# Altium schematic symbol library jlcpcb_2025_04_capacitors_extended_0805.schlib: 3281 symbols (part 4 of 18)
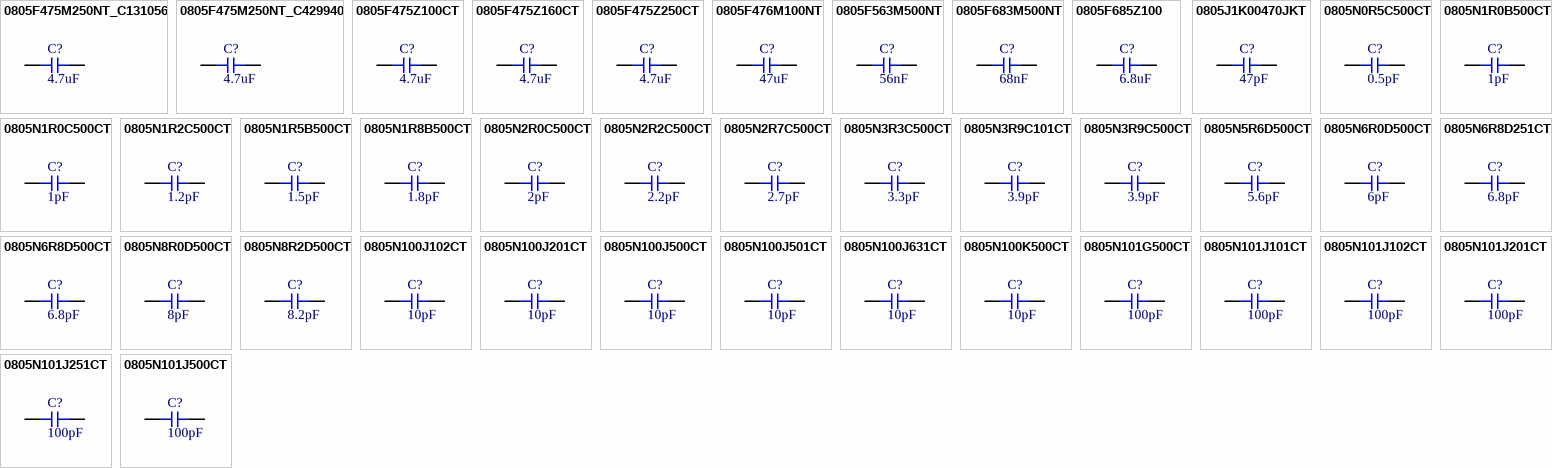
[diagram p85: symbols 0805F475M250NT_C131056 to 0805N101J500CT]

## 0805N1R5B500CT
designator C?  Capacitance: 1.5pF  (hidden comment: *)
Capacitor, Ceramic (MLCC), 1.5pF, 50V, NP0, SMD 0805; Manufacturer: Walsin Tech Corp; Manufacturer Part Number: 0805N1R5B500CT; Package Size: 0805; JLCPCB Basic Part: No; JLCPCB Part Number: C509268; Supplier 1: LCSC; Category: Capacitors - MLCC; Supplier Part Number 1: C509268; Voltage Rating: 50V; Temperature Coefficient: NP0; RoHS: Yes; ComponentLink1Description: Datasheet; ComponentLink1URL: https://wmsc.lcsc.com/wmsc/upload/file/pdf/v2/lcsc/2304140030_Walsin-Tech-Corp-0805N1R5B500CT_C509268.pdf; ComponentLink2Description: JLCPCB Part URL; ComponentLink2URL: https://jlcpcb.com/partdetail/C509268; ComponentLink3Description: LCSC Part URL; ComponentLink3URL: https://lcsc.com/product-detail/Multilayer-Ceramic-Capacitors-MLCC---SMD-SMT_Walsin-Tech-Corp-Walsin-Tech-Corp-0805N1R5B500CT_C509268.html
footprint CAP-0805 (0805 (2012M) Capacitor)
pins: 1, 2

## 0805N1R8B500CT
designator C?  Capacitance: 1.8pF  (hidden comment: *)
Capacitor, Ceramic (MLCC), 1.8pF, 50V, NP0, SMD 0805; Manufacturer: Walsin Tech Corp; Manufacturer Part Number: 0805N1R8B500CT; Package Size: 0805; JLCPCB Basic Part: No; JLCPCB Part Number: C509269; Supplier 1: LCSC; Category: Capacitors - MLCC; Supplier Part Number 1: C509269; Voltage Rating: 50V; Temperature Coefficient: NP0; RoHS: Yes; ComponentLink1Description: Datasheet; ComponentLink1URL: https://wmsc.lcsc.com/wmsc/upload/file/pdf/v2/lcsc/2304140030_Walsin-Tech-Corp-0805N1R8B500CT_C509269.pdf; ComponentLink2Description: JLCPCB Part URL; ComponentLink2URL: https://jlcpcb.com/partdetail/C509269; ComponentLink3Description: LCSC Part URL; ComponentLink3URL: https://lcsc.com/product-detail/Multilayer-Ceramic-Capacitors-MLCC---SMD-SMT_Walsin-Tech-Corp-Walsin-Tech-Corp-0805N1R8B500CT_C509269.html
footprint CAP-0805 (0805 (2012M) Capacitor)
pins: 1, 2

## 0805N2R0C500CT
designator C?  Capacitance: 2pF  (hidden comment: *)
Capacitor, Ceramic (MLCC), 2pF, 50V, NP0, SMD 0805; Manufacturer: Walsin Tech Corp; Manufacturer Part Number: 0805N2R0C500CT; Package Size: 0805; JLCPCB Basic Part: No; JLCPCB Part Number: C296094; Supplier 1: LCSC; Category: Capacitors - MLCC; Supplier Part Number 1: C296094; Voltage Rating: 50V; Temperature Coefficient: NP0; RoHS: Yes; ComponentLink1Description: Datasheet; ComponentLink1URL: https://wmsc.lcsc.com/wmsc/upload/file/pdf/v2/lcsc/2304140030_Walsin-Tech-Corp-0805N2R0C500CT_C296094.pdf; ComponentLink2Description: JLCPCB Part URL; ComponentLink2URL: https://jlcpcb.com/partdetail/C296094; ComponentLink3Description: LCSC Part URL; ComponentLink3URL: https://lcsc.com/product-detail/Multilayer-Ceramic-Capacitors-MLCC---SMD-SMT_Walsin-Tech-Corp-Walsin-Tech-Corp-0805N2R0C500CT_C296094.html
footprint CAP-0805 (0805 (2012M) Capacitor)
pins: 1, 2

## 0805N2R2C500CT
designator C?  Capacitance: 2.2pF  (hidden comment: *)
Capacitor, Ceramic (MLCC), 2.2pF, 50V, NP0, SMD 0805; Manufacturer: Walsin Tech Corp; Manufacturer Part Number: 0805N2R2C500CT; Package Size: 0805; JLCPCB Basic Part: No; JLCPCB Part Number: C424848; Supplier 1: LCSC; Category: Capacitors - MLCC; Supplier Part Number 1: C424848; Voltage Rating: 50V; Temperature Coefficient: NP0; RoHS: Yes; ComponentLink1Description: Datasheet; ComponentLink1URL: https://wmsc.lcsc.com/wmsc/upload/file/pdf/v2/lcsc/2304140030_Walsin-Tech-Corp-0805N2R2C500CT_C424848.pdf; ComponentLink2Description: JLCPCB Part URL; ComponentLink2URL: https://jlcpcb.com/partdetail/C424848; ComponentLink3Description: LCSC Part URL; ComponentLink3URL: https://lcsc.com/product-detail/Multilayer-Ceramic-Capacitors-MLCC---SMD-SMT_Walsin-Tech-Corp-Walsin-Tech-Corp-0805N2R2C500CT_C424848.html
footprint CAP-0805 (0805 (2012M) Capacitor)
pins: 1, 2

## 0805N2R7C500CT
designator C?  Capacitance: 2.7pF  (hidden comment: *)
Capacitor, Ceramic (MLCC), 2.7pF, 50V, NP0, SMD 0805; Manufacturer: Walsin Tech Corp; Manufacturer Part Number: 0805N2R7C500CT; Package Size: 0805; JLCPCB Basic Part: No; JLCPCB Part Number: C296095; Supplier 1: LCSC; Category: Capacitors - MLCC; Supplier Part Number 1: C296095; Voltage Rating: 50V; Temperature Coefficient: NP0; RoHS: Yes; ComponentLink1Description: Datasheet; ComponentLink1URL: https://wmsc.lcsc.com/wmsc/upload/file/pdf/v2/lcsc/2304140030_Walsin-Tech-Corp-0805N2R7C500CT_C296095.pdf; ComponentLink2Description: JLCPCB Part URL; ComponentLink2URL: https://jlcpcb.com/partdetail/C296095; ComponentLink3Description: LCSC Part URL; ComponentLink3URL: https://lcsc.com/product-detail/Multilayer-Ceramic-Capacitors-MLCC---SMD-SMT_Walsin-Tech-Corp-Walsin-Tech-Corp-0805N2R7C500CT_C296095.html
footprint CAP-0805 (0805 (2012M) Capacitor)
pins: 1, 2

## 0805N3R3C500CT
designator C?  Capacitance: 3.3pF  (hidden comment: *)
Capacitor, Ceramic (MLCC), 3.3pF, 50V, NP0, SMD 0805; Manufacturer: Walsin Tech Corp; Manufacturer Part Number: 0805N3R3C500CT; Package Size: 0805; JLCPCB Basic Part: No; JLCPCB Part Number: C424849; Supplier 1: LCSC; Category: Capacitors - MLCC; Supplier Part Number 1: C424849; Voltage Rating: 50V; Temperature Coefficient: NP0; RoHS: Yes; ComponentLink1Description: Datasheet; ComponentLink1URL: https://wmsc.lcsc.com/wmsc/upload/file/pdf/v2/lcsc/2304140030_Walsin-Tech-Corp-0805N3R3C500CT_C424849.pdf; ComponentLink2Description: JLCPCB Part URL; ComponentLink2URL: https://jlcpcb.com/partdetail/C424849; ComponentLink3Description: LCSC Part URL; ComponentLink3URL: https://lcsc.com/product-detail/Multilayer-Ceramic-Capacitors-MLCC---SMD-SMT_Walsin-Tech-Corp-Walsin-Tech-Corp-0805N3R3C500CT_C424849.html
footprint CAP-0805 (0805 (2012M) Capacitor)
pins: 1, 2

## 0805N3R9C101CT
designator C?  Capacitance: 3.9pF  (hidden comment: *)
Capacitor, Ceramic (MLCC), 3.9pF, 100V, C0G, SMD 0805; Manufacturer: Walsin Tech Corp; Manufacturer Part Number: 0805N3R9C101CT; Package Size: 0805; JLCPCB Basic Part: No; JLCPCB Part Number: C3903056; Supplier 1: LCSC; Category: Capacitors - MLCC; Supplier Part Number 1: C3903056; Voltage Rating: 100V; Temperature Coefficient: C0G; RoHS: Yes; ComponentLink1Description: Datasheet; ComponentLink1URL: https://wmsc.lcsc.com/wmsc/upload/file/pdf/v2/lcsc/2309201537_Walsin-Tech-Corp-0805N3R9C101CT_C3903056.pdf; ComponentLink2Description: JLCPCB Part URL; ComponentLink2URL: https://jlcpcb.com/partdetail/C3903056; ComponentLink3Description: LCSC Part URL; ComponentLink3URL: https://lcsc.com/product-detail/Multilayer-Ceramic-Capacitors-MLCC---SMD-SMT_Walsin-Tech-Corp-Walsin-Tech-Corp-0805N3R9C101CT_C3903056.html
footprint CAP-0805 (0805 (2012M) Capacitor)
pins: 1, 2

## 0805N3R9C500CT
designator C?  Capacitance: 3.9pF  (hidden comment: *)
Capacitor, Ceramic (MLCC), 3.9pF, 50V, NP0, SMD 0805; Manufacturer: Walsin Tech Corp; Manufacturer Part Number: 0805N3R9C500CT; Package Size: 0805; JLCPCB Basic Part: No; JLCPCB Part Number: C296100; Supplier 1: LCSC; Category: Capacitors - MLCC; Supplier Part Number 1: C296100; Voltage Rating: 50V; Temperature Coefficient: NP0; RoHS: Yes; ComponentLink1Description: Datasheet; ComponentLink1URL: https://wmsc.lcsc.com/wmsc/upload/file/pdf/v2/lcsc/2304140030_Walsin-Tech-Corp-0805N3R9C500CT_C296100.pdf; ComponentLink2Description: JLCPCB Part URL; ComponentLink2URL: https://jlcpcb.com/partdetail/C296100; ComponentLink3Description: LCSC Part URL; ComponentLink3URL: https://lcsc.com/product-detail/Multilayer-Ceramic-Capacitors-MLCC---SMD-SMT_Walsin-Tech-Corp-Walsin-Tech-Corp-0805N3R9C500CT_C296100.html
footprint CAP-0805 (0805 (2012M) Capacitor)
pins: 1, 2

## 0805N5R6D500CT
designator C?  Capacitance: 5.6pF  (hidden comment: *)
Capacitor, Ceramic (MLCC), 5.6pF, 50V, NP0, SMD 0805; Manufacturer: Walsin Tech Corp; Manufacturer Part Number: 0805N5R6D500CT; Package Size: 0805; JLCPCB Basic Part: No; JLCPCB Part Number: C296104; Supplier 1: LCSC; Category: Capacitors - MLCC; Supplier Part Number 1: C296104; Voltage Rating: 50V; Temperature Coefficient: NP0; RoHS: Yes; ComponentLink1Description: Datasheet; ComponentLink1URL: https://wmsc.lcsc.com/wmsc/upload/file/pdf/v2/lcsc/2304140030_Walsin-Tech-Corp-0805N5R6D500CT_C296104.pdf; ComponentLink2Description: JLCPCB Part URL; ComponentLink2URL: https://jlcpcb.com/partdetail/C296104; ComponentLink3Description: LCSC Part URL; ComponentLink3URL: https://lcsc.com/product-detail/Multilayer-Ceramic-Capacitors-MLCC---SMD-SMT_Walsin-Tech-Corp-Walsin-Tech-Corp-0805N5R6D500CT_C296104.html
footprint CAP-0805 (0805 (2012M) Capacitor)
pins: 1, 2

## 0805N6R0D500CT
designator C?  Capacitance: 6pF  (hidden comment: *)
Capacitor, Ceramic (MLCC), 6pF, 50V, NP0, SMD 0805; Manufacturer: Walsin Tech Corp; Manufacturer Part Number: 0805N6R0D500CT; Package Size: 0805; JLCPCB Basic Part: No; JLCPCB Part Number: C424859; Supplier 1: LCSC; Category: Capacitors - MLCC; Supplier Part Number 1: C424859; Voltage Rating: 50V; Temperature Coefficient: NP0; RoHS: Yes; ComponentLink1Description: Datasheet; ComponentLink1URL: https://wmsc.lcsc.com/wmsc/upload/file/pdf/v2/lcsc/2304140030_Walsin-Tech-Corp-0805N6R0D500CT_C424859.pdf; ComponentLink2Description: JLCPCB Part URL; ComponentLink2URL: https://jlcpcb.com/partdetail/C424859; ComponentLink3Description: LCSC Part URL; ComponentLink3URL: https://lcsc.com/product-detail/Multilayer-Ceramic-Capacitors-MLCC---SMD-SMT_Walsin-Tech-Corp-Walsin-Tech-Corp-0805N6R0D500CT_C424859.html
footprint CAP-0805 (0805 (2012M) Capacitor)
pins: 1, 2

## 0805N6R8D251CT
designator C?  Capacitance: 6.8pF  (hidden comment: *)
Capacitor, Ceramic (MLCC), 6.8pF, 250V, C0G, SMD 0805; Manufacturer: Walsin Tech Corp; Manufacturer Part Number: 0805N6R8D251CT; Package Size: 0805; JLCPCB Basic Part: No; JLCPCB Part Number: C3887194; Supplier 1: LCSC; Category: Capacitors - MLCC; Supplier Part Number 1: C3887194; Voltage Rating: 250V; Temperature Coefficient: C0G; RoHS: Yes; ComponentLink1Description: Datasheet; ComponentLink1URL: https://wmsc.lcsc.com/wmsc/upload/file/pdf/v2/lcsc/2309201537_Walsin-Tech-Corp-0805N6R8D251CT_C3887194.pdf; ComponentLink2Description: JLCPCB Part URL; ComponentLink2URL: https://jlcpcb.com/partdetail/C3887194; ComponentLink3Description: LCSC Part URL; ComponentLink3URL: https://lcsc.com/product-detail/Multilayer-Ceramic-Capacitors-MLCC---SMD-SMT_Walsin-Tech-Corp-Walsin-Tech-Corp-0805N6R8D251CT_C3887194.html
footprint CAP-0805 (0805 (2012M) Capacitor)
pins: 1, 2

## 0805N6R8D500CT
designator C?  Capacitance: 6.8pF  (hidden comment: *)
Capacitor, Ceramic (MLCC), 6.8pF, 50V, NP0, SMD 0805; Manufacturer: Walsin Tech Corp; Manufacturer Part Number: 0805N6R8D500CT; Package Size: 0805; JLCPCB Basic Part: No; JLCPCB Part Number: C296105; Supplier 1: LCSC; Category: Capacitors - MLCC; Supplier Part Number 1: C296105; Voltage Rating: 50V; Temperature Coefficient: NP0; RoHS: Yes; ComponentLink1Description: Datasheet; ComponentLink1URL: https://wmsc.lcsc.com/wmsc/upload/file/pdf/v2/lcsc/2304140030_Walsin-Tech-Corp-0805N6R8D500CT_C296105.pdf; ComponentLink2Description: JLCPCB Part URL; ComponentLink2URL: https://jlcpcb.com/partdetail/C296105; ComponentLink3Description: LCSC Part URL; ComponentLink3URL: https://lcsc.com/product-detail/Multilayer-Ceramic-Capacitors-MLCC---SMD-SMT_Walsin-Tech-Corp-Walsin-Tech-Corp-0805N6R8D500CT_C296105.html
footprint CAP-0805 (0805 (2012M) Capacitor)
pins: 1, 2

## 0805N8R0D500CT
designator C?  Capacitance: 8pF  (hidden comment: *)
Capacitor, Ceramic (MLCC), 8pF, 50V, NP0, SMD 0805; Manufacturer: Walsin Tech Corp; Manufacturer Part Number: 0805N8R0D500CT; Package Size: 0805; JLCPCB Basic Part: No; JLCPCB Part Number: C296108; Supplier 1: LCSC; Category: Capacitors - MLCC; Supplier Part Number 1: C296108; Voltage Rating: 50V; Temperature Coefficient: NP0; RoHS: Yes; ComponentLink1Description: Datasheet; ComponentLink1URL: https://wmsc.lcsc.com/wmsc/upload/file/pdf/v2/lcsc/2304140030_Walsin-Tech-Corp-0805N8R0D500CT_C296108.pdf; ComponentLink2Description: JLCPCB Part URL; ComponentLink2URL: https://jlcpcb.com/partdetail/C296108; ComponentLink3Description: LCSC Part URL; ComponentLink3URL: https://lcsc.com/product-detail/Multilayer-Ceramic-Capacitors-MLCC---SMD-SMT_Walsin-Tech-Corp-Walsin-Tech-Corp-0805N8R0D500CT_C296108.html
footprint CAP-0805 (0805 (2012M) Capacitor)
pins: 1, 2

## 0805N8R2D500CT
designator C?  Capacitance: 8.2pF  (hidden comment: *)
Capacitor, Ceramic (MLCC), 8.2pF, 50V, NP0, SMD 0805; Manufacturer: Walsin Tech Corp; Manufacturer Part Number: 0805N8R2D500CT; Package Size: 0805; JLCPCB Basic Part: No; JLCPCB Part Number: C396767; Supplier 1: LCSC; Category: Capacitors - MLCC; Supplier Part Number 1: C396767; Voltage Rating: 50V; Temperature Coefficient: NP0; RoHS: Yes; ComponentLink1Description: Datasheet; ComponentLink1URL: https://wmsc.lcsc.com/wmsc/upload/file/pdf/v2/lcsc/2304140030_Walsin-Tech-Corp-0805N8R2D500CT_C396767.pdf; ComponentLink2Description: JLCPCB Part URL; ComponentLink2URL: https://jlcpcb.com/partdetail/C396767; ComponentLink3Description: LCSC Part URL; ComponentLink3URL: https://lcsc.com/product-detail/Multilayer-Ceramic-Capacitors-MLCC---SMD-SMT_Walsin-Tech-Corp-Walsin-Tech-Corp-0805N8R2D500CT_C396767.html
footprint CAP-0805 (0805 (2012M) Capacitor)
pins: 1, 2

## 0805N100J102CT
designator C?  Capacitance: 10pF  (hidden comment: *)
Capacitor, Ceramic (MLCC), 10pF, ±5%, 1kV, NP0, ±5%, SMD 0805; Manufacturer: Walsin Tech Corp; Manufacturer Part Number: 0805N100J102CT; Package Size: 0805; JLCPCB Basic Part: No; JLCPCB Part Number: C2991412; Supplier 1: LCSC; Category: Capacitors - MLCC; Supplier Part Number 1: C2991412; Tolerance: ±5%; Voltage Rating: 1kV; Temperature Coefficient: NP0; RoHS: Yes; ComponentLink1Description: Datasheet; ComponentLink1URL: https://wmsc.lcsc.com/wmsc/upload/file/pdf/v2/lcsc/2204082330_Walsin-Tech-Corp-0805N100J102CT_C2991412.pdf; ComponentLink2Description: JLCPCB Part URL; ComponentLink2URL: https://jlcpcb.com/partdetail/C2991412; ComponentLink3Description: LCSC Part URL; ComponentLink3URL: https://lcsc.com/product-detail/Multilayer-Ceramic-Capacitors-MLCC---SMD-SMT_Walsin-Tech-Corp-Walsin-Tech-Corp-0805N100J102CT_C2991412.html
footprint CAP-0805 (0805 (2012M) Capacitor)
pins: 1, 2

## 0805N100J201CT
designator C?  Capacitance: 10pF  (hidden comment: *)
Capacitor, Ceramic (MLCC), 10pF, ±5%, 200V, NP0, ±5%, SMD 0805; Manufacturer: Walsin Tech Corp; Manufacturer Part Number: 0805N100J201CT; Package Size: 0805; JLCPCB Basic Part: No; JLCPCB Part Number: C880827; Supplier 1: LCSC; Category: Capacitors - MLCC; Supplier Part Number 1: C880827; Tolerance: ±5%; Voltage Rating: 200V; Temperature Coefficient: NP0; RoHS: Yes; ComponentLink1Description: Datasheet; ComponentLink1URL: https://wmsc.lcsc.com/wmsc/upload/file/pdf/v2/lcsc/2304140030_Walsin-Tech-Corp-0805N100J201CT_C880827.pdf; ComponentLink2Description: JLCPCB Part URL; ComponentLink2URL: https://jlcpcb.com/partdetail/C880827; ComponentLink3Description: LCSC Part URL; ComponentLink3URL: https://lcsc.com/product-detail/Multilayer-Ceramic-Capacitors-MLCC---SMD-SMT_Walsin-Tech-Corp-Walsin-Tech-Corp-0805N100J201CT_C880827.html
footprint CAP-0805 (0805 (2012M) Capacitor)
pins: 1, 2

## 0805N100J500CT
designator C?  Capacitance: 10pF  (hidden comment: *)
Capacitor, Ceramic (MLCC), 10pF, ±5%, 50V, NP0, ±5%, SMD 0805; Manufacturer: Walsin Tech Corp; Manufacturer Part Number: 0805N100J500CT; Package Size: 0805; JLCPCB Basic Part: No; JLCPCB Part Number: C123640; Supplier 1: LCSC; Category: Capacitors - MLCC; Supplier Part Number 1: C123640; Tolerance: ±5%; Voltage Rating: 50V; Temperature Coefficient: NP0; RoHS: Yes; ComponentLink1Description: Datasheet; ComponentLink1URL: https://wmsc.lcsc.com/wmsc/upload/file/pdf/v2/lcsc/2304140030_Walsin-Tech-Corp-0805N100J500CT_C123640.pdf; ComponentLink2Description: JLCPCB Part URL; ComponentLink2URL: https://jlcpcb.com/partdetail/C123640; ComponentLink3Description: LCSC Part URL; ComponentLink3URL: https://lcsc.com/product-detail/Multilayer-Ceramic-Capacitors-MLCC---SMD-SMT_Walsin-Tech-Corp-Walsin-Tech-Corp-0805N100J500CT_C123640.html
footprint CAP-0805 (0805 (2012M) Capacitor)
pins: 1, 2

## 0805N100J501CT
designator C?  Capacitance: 10pF  (hidden comment: *)
Capacitor, Ceramic (MLCC), 10pF, ±5%, 500V, NP0, ±5%, SMD 0805; Manufacturer: Walsin Tech Corp; Manufacturer Part Number: 0805N100J501CT; Package Size: 0805; JLCPCB Basic Part: No; JLCPCB Part Number: C384748; Supplier 1: LCSC; Category: Capacitors - MLCC; Supplier Part Number 1: C384748; Tolerance: ±5%; Voltage Rating: 500V; Temperature Coefficient: NP0; RoHS: Yes; ComponentLink1Description: Datasheet; ComponentLink1URL: https://wmsc.lcsc.com/wmsc/upload/file/pdf/v2/lcsc/2304140030_Walsin-Tech-Corp-0805N100J501CT_C384748.pdf; ComponentLink2Description: JLCPCB Part URL; ComponentLink2URL: https://jlcpcb.com/partdetail/C384748; ComponentLink3Description: LCSC Part URL; ComponentLink3URL: https://lcsc.com/product-detail/Multilayer-Ceramic-Capacitors-MLCC---SMD-SMT_Walsin-Tech-Corp-Walsin-Tech-Corp-0805N100J501CT_C384748.html
footprint CAP-0805 (0805 (2012M) Capacitor)
pins: 1, 2

## 0805N100J631CT
designator C?  Capacitance: 10pF  (hidden comment: *)
Capacitor, Ceramic (MLCC), 10pF, ±5%, 630V, NP0, ±5%, SMD 0805; Manufacturer: Walsin Tech Corp; Manufacturer Part Number: 0805N100J631CT; Package Size: 0805; JLCPCB Basic Part: No; JLCPCB Part Number: C2909413; Supplier 1: LCSC; Category: Capacitors - MLCC; Supplier Part Number 1: C2909413; Tolerance: ±5%; Voltage Rating: 630V; Temperature Coefficient: NP0; RoHS: Yes; ComponentLink1Description: Datasheet; ComponentLink1URL: https://wmsc.lcsc.com/wmsc/upload/file/pdf/v2/lcsc/2111030930_Walsin-Tech-Corp-0805N100J631CT_C2909413.pdf; ComponentLink2Description: JLCPCB Part URL; ComponentLink2URL: https://jlcpcb.com/partdetail/C2909413; ComponentLink3Description: LCSC Part URL; ComponentLink3URL: https://lcsc.com/product-detail/Multilayer-Ceramic-Capacitors-MLCC---SMD-SMT_Walsin-Tech-Corp-Walsin-Tech-Corp-0805N100J631CT_C2909413.html
footprint CAP-0805 (0805 (2012M) Capacitor)
pins: 1, 2

## 0805N100K500CT
designator C?  Capacitance: 10pF  (hidden comment: *)
Capacitor, Ceramic (MLCC), 10pF, ±10%, 50V, NP0, ±10%, SMD 0805; Manufacturer: Walsin Tech Corp; Manufacturer Part Number: 0805N100K500CT; Package Size: 0805; JLCPCB Basic Part: No; JLCPCB Part Number: C296083; Supplier 1: LCSC; Category: Capacitors - MLCC; Supplier Part Number 1: C296083; Tolerance: ±10%; Voltage Rating: 50V; Temperature Coefficient: NP0; RoHS: Yes; ComponentLink1Description: Datasheet; ComponentLink1URL: https://wmsc.lcsc.com/wmsc/upload/file/pdf/v2/lcsc/2304140030_Walsin-Tech-Corp-0805N100K500CT_C296083.pdf; ComponentLink2Description: JLCPCB Part URL; ComponentLink2URL: https://jlcpcb.com/partdetail/C296083; ComponentLink3Description: LCSC Part URL; ComponentLink3URL: https://lcsc.com/product-detail/Multilayer-Ceramic-Capacitors-MLCC---SMD-SMT_Walsin-Tech-Corp-Walsin-Tech-Corp-0805N100K500CT_C296083.html
footprint CAP-0805 (0805 (2012M) Capacitor)
pins: 1, 2

## 0805N101G500CT
designator C?  Capacitance: 100pF  (hidden comment: *)
Capacitor, Ceramic (MLCC), 100pF, ±2%, 50V, NP0, ±2%, SMD 0805; Manufacturer: Walsin Tech Corp; Manufacturer Part Number: 0805N101G500CT; Package Size: 0805; JLCPCB Basic Part: No; JLCPCB Part Number: C296084; Supplier 1: LCSC; Category: Capacitors - MLCC; Supplier Part Number 1: C296084; Tolerance: ±2%; Voltage Rating: 50V; Temperature Coefficient: NP0; RoHS: Yes; ComponentLink1Description: Datasheet; ComponentLink1URL: https://wmsc.lcsc.com/wmsc/upload/file/pdf/v2/lcsc/2304140030_Walsin-Tech-Corp-0805N101G500CT_C296084.pdf; ComponentLink2Description: JLCPCB Part URL; ComponentLink2URL: https://jlcpcb.com/partdetail/C296084; ComponentLink3Description: LCSC Part URL; ComponentLink3URL: https://lcsc.com/product-detail/Multilayer-Ceramic-Capacitors-MLCC---SMD-SMT_Walsin-Tech-Corp-Walsin-Tech-Corp-0805N101G500CT_C296084.html
footprint CAP-0805 (0805 (2012M) Capacitor)
pins: 1, 2

## 0805N101J101CT
designator C?  Capacitance: 100pF  (hidden comment: *)
Capacitor, Ceramic (MLCC), 100pF, ±5%, 100V, NP0, ±5%, SMD 0805; Manufacturer: Walsin Tech Corp; Manufacturer Part Number: 0805N101J101CT; Package Size: 0805; JLCPCB Basic Part: No; JLCPCB Part Number: C77481; Supplier 1: LCSC; Category: Capacitors - MLCC; Supplier Part Number 1: C77481; Tolerance: ±5%; Voltage Rating: 100V; Temperature Coefficient: NP0; RoHS: Yes; ComponentLink1Description: Datasheet; ComponentLink1URL: https://wmsc.lcsc.com/wmsc/upload/file/pdf/v2/lcsc/2304140030_Walsin-Tech-Corp-0805N101J101CT_C77481.pdf; ComponentLink2Description: JLCPCB Part URL; ComponentLink2URL: https://jlcpcb.com/partdetail/C77481; ComponentLink3Description: LCSC Part URL; ComponentLink3URL: https://lcsc.com/product-detail/Multilayer-Ceramic-Capacitors-MLCC---SMD-SMT_Walsin-Tech-Corp-Walsin-Tech-Corp-0805N101J101CT_C77481.html
footprint CAP-0805 (0805 (2012M) Capacitor)
pins: 1, 2

## 0805N101J102CT
designator C?  Capacitance: 100pF  (hidden comment: *)
Capacitor, Ceramic (MLCC), 100pF, ±5%, 1kV, NP0, ±5%, SMD 0805; Manufacturer: Walsin Tech Corp; Manufacturer Part Number: 0805N101J102CT; Package Size: 0805; JLCPCB Basic Part: No; JLCPCB Part Number: C458931; Supplier 1: LCSC; Category: Capacitors - MLCC; Supplier Part Number 1: C458931; Tolerance: ±5%; Voltage Rating: 1kV; Temperature Coefficient: NP0; RoHS: Yes; ComponentLink1Description: Datasheet; ComponentLink1URL: https://wmsc.lcsc.com/wmsc/upload/file/pdf/v2/lcsc/2304140030_Walsin-Tech-Corp-0805N101J102CT_C458931.pdf; ComponentLink2Description: JLCPCB Part URL; ComponentLink2URL: https://jlcpcb.com/partdetail/C458931; ComponentLink3Description: LCSC Part URL; ComponentLink3URL: https://lcsc.com/product-detail/Multilayer-Ceramic-Capacitors-MLCC---SMD-SMT_Walsin-Tech-Corp-Walsin-Tech-Corp-0805N101J102CT_C458931.html
footprint CAP-0805 (0805 (2012M) Capacitor)
pins: 1, 2

## 0805N101J201CT
designator C?  Capacitance: 100pF  (hidden comment: *)
Capacitor, Ceramic (MLCC), 100pF, ±5%, 200V, NP0, ±5%, SMD 0805; Manufacturer: Walsin Tech Corp; Manufacturer Part Number: 0805N101J201CT; Package Size: 0805; JLCPCB Basic Part: No; JLCPCB Part Number: C396743; Supplier 1: LCSC; Category: Capacitors - MLCC; Supplier Part Number 1: C396743; Tolerance: ±5%; Voltage Rating: 200V; Temperature Coefficient: NP0; RoHS: Yes; ComponentLink1Description: Datasheet; ComponentLink1URL: https://wmsc.lcsc.com/wmsc/upload/file/pdf/v2/lcsc/2304140030_Walsin-Tech-Corp-0805N101J201CT_C396743.pdf; ComponentLink2Description: JLCPCB Part URL; ComponentLink2URL: https://jlcpcb.com/partdetail/C396743; ComponentLink3Description: LCSC Part URL; ComponentLink3URL: https://lcsc.com/product-detail/Multilayer-Ceramic-Capacitors-MLCC---SMD-SMT_Walsin-Tech-Corp-Walsin-Tech-Corp-0805N101J201CT_C396743.html
footprint CAP-0805 (0805 (2012M) Capacitor)
pins: 1, 2

## 0805N101J251CT
designator C?  Capacitance: 100pF  (hidden comment: *)
Capacitor, Ceramic (MLCC), 100pF, ±5%, 250V, NP0, ±5%, SMD 0805; Manufacturer: Walsin Tech Corp; Manufacturer Part Number: 0805N101J251CT; Package Size: 0805; JLCPCB Basic Part: No; JLCPCB Part Number: C152852; Supplier 1: LCSC; Category: Capacitors - MLCC; Supplier Part Number 1: C152852; Tolerance: ±5%; Voltage Rating: 250V; Temperature Coefficient: NP0; RoHS: Yes; ComponentLink1Description: Datasheet; ComponentLink1URL: https://wmsc.lcsc.com/wmsc/upload/file/pdf/v2/lcsc/2304140030_Walsin-Tech-Corp-0805N101J251CT_C152852.pdf; ComponentLink2Description: JLCPCB Part URL; ComponentLink2URL: https://jlcpcb.com/partdetail/C152852; ComponentLink3Description: LCSC Part URL; ComponentLink3URL: https://lcsc.com/product-detail/Multilayer-Ceramic-Capacitors-MLCC---SMD-SMT_Walsin-Tech-Corp-Walsin-Tech-Corp-0805N101J251CT_C152852.html
footprint CAP-0805 (0805 (2012M) Capacitor)
pins: 1, 2

## 0805N101J500CT
designator C?  Capacitance: 100pF  (hidden comment: *)
Capacitor, Ceramic (MLCC), 100pF, ±5%, 50V, NP0, ±5%, SMD 0805; Manufacturer: Walsin Tech Corp; Manufacturer Part Number: 0805N101J500CT; Package Size: 0805; JLCPCB Basic Part: No; JLCPCB Part Number: C152851; Supplier 1: LCSC; Category: Capacitors - MLCC; Supplier Part Number 1: C152851; Tolerance: ±5%; Voltage Rating: 50V; Temperature Coefficient: NP0; RoHS: Yes; ComponentLink1Description: Datasheet; ComponentLink1URL: https://wmsc.lcsc.com/wmsc/upload/file/pdf/v2/lcsc/2304140030_Walsin-Tech-Corp-0805N101J500CT_C152851.pdf; ComponentLink2Description: JLCPCB Part URL; ComponentLink2URL: https://jlcpcb.com/partdetail/C152851; ComponentLink3Description: LCSC Part URL; ComponentLink3URL: https://lcsc.com/product-detail/Multilayer-Ceramic-Capacitors-MLCC---SMD-SMT_Walsin-Tech-Corp-Walsin-Tech-Corp-0805N101J500CT_C152851.html
footprint CAP-0805 (0805 (2012M) Capacitor)
pins: 1, 2

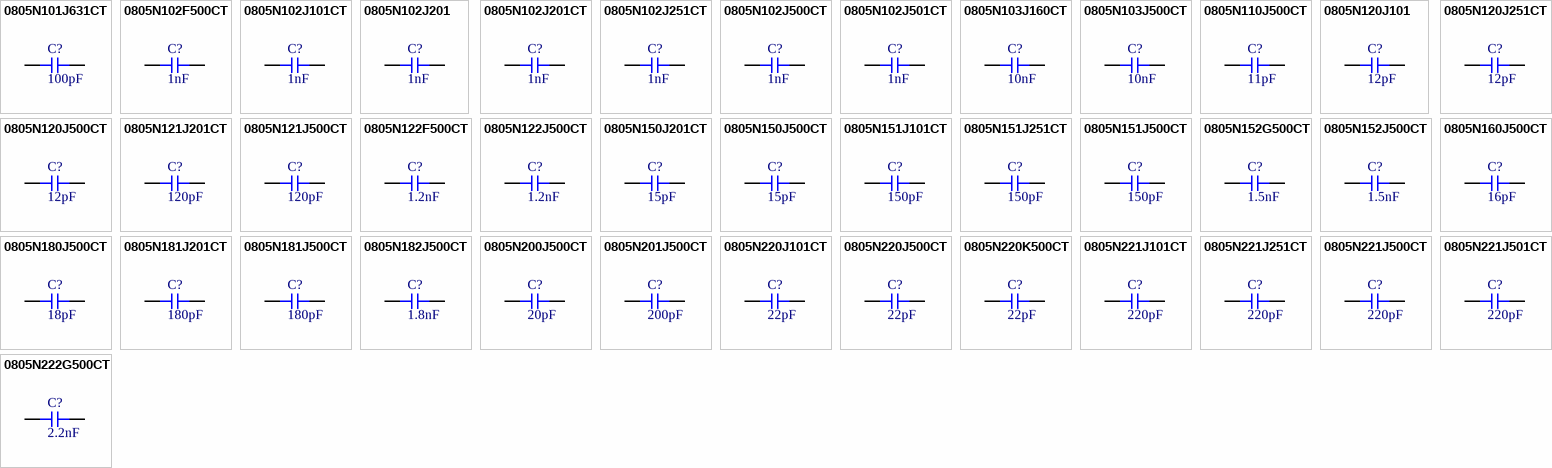
[diagram p14: symbols 0805N101J631CT to 0805N222G500CT]

## 0805N101J631CT
designator C?  Capacitance: 100pF  (hidden comment: *)
Capacitor, Ceramic (MLCC), 100pF, ±5%, 630V, NP0, ±5%, SMD 0805; Manufacturer: Walsin Tech Corp; Manufacturer Part Number: 0805N101J631CT; Package Size: 0805; JLCPCB Basic Part: No; JLCPCB Part Number: C152978; Supplier 1: LCSC; Category: Capacitors - MLCC; Supplier Part Number 1: C152978; Tolerance: ±5%; Voltage Rating: 630V; Temperature Coefficient: NP0; RoHS: Yes; ComponentLink1Description: Datasheet; ComponentLink1URL: https://wmsc.lcsc.com/wmsc/upload/file/pdf/v2/lcsc/2304140030_Walsin-Tech-Corp-0805N101J631CT_C152978.pdf; ComponentLink2Description: JLCPCB Part URL; ComponentLink2URL: https://jlcpcb.com/partdetail/C152978; ComponentLink3Description: LCSC Part URL; ComponentLink3URL: https://lcsc.com/product-detail/Multilayer-Ceramic-Capacitors-MLCC---SMD-SMT_Walsin-Tech-Corp-Walsin-Tech-Corp-0805N101J631CT_C152978.html
footprint CAP-0805 (0805 (2012M) Capacitor)
pins: 1, 2

## 0805N102F500CT
designator C?  Capacitance: 1nF  (hidden comment: *)
Capacitor, Ceramic (MLCC), 1nF, ±1%, 50V, NP0, ±1%, SMD 0805; Manufacturer: Walsin Tech Corp; Manufacturer Part Number: 0805N102F500CT; Package Size: 0805; JLCPCB Basic Part: No; JLCPCB Part Number: C2894193; Supplier 1: LCSC; Category: Capacitors - MLCC; Supplier Part Number 1: C2894193; Tolerance: ±1%; Voltage Rating: 50V; Temperature Coefficient: NP0; RoHS: Yes; ComponentLink1Description: Datasheet; ComponentLink1URL: https://wmsc.lcsc.com/wmsc/upload/file/pdf/v2/lcsc/2109081830_Walsin-Tech-Corp-0805N102F500CT_C2894193.pdf; ComponentLink2Description: JLCPCB Part URL; ComponentLink2URL: https://jlcpcb.com/partdetail/C2894193; ComponentLink3Description: LCSC Part URL; ComponentLink3URL: https://lcsc.com/product-detail/Multilayer-Ceramic-Capacitors-MLCC---SMD-SMT_Walsin-Tech-Corp-Walsin-Tech-Corp-0805N102F500CT_C2894193.html
footprint CAP-0805 (0805 (2012M) Capacitor)
pins: 1, 2

## 0805N102J101CT
designator C?  Capacitance: 1nF  (hidden comment: *)
Capacitor, Ceramic (MLCC), 1nF, ±5%, 100V, NP0, ±5%, SMD 0805; Manufacturer: Walsin Tech Corp; Manufacturer Part Number: 0805N102J101CT; Package Size: 0805; JLCPCB Basic Part: No; JLCPCB Part Number: C396744; Supplier 1: LCSC; Category: Capacitors - MLCC; Supplier Part Number 1: C396744; Tolerance: ±5%; Voltage Rating: 100V; Temperature Coefficient: NP0; RoHS: Yes; ComponentLink1Description: Datasheet; ComponentLink1URL: https://wmsc.lcsc.com/wmsc/upload/file/pdf/v2/lcsc/2304140030_Walsin-Tech-Corp-0805N102J101CT_C396744.pdf; ComponentLink2Description: JLCPCB Part URL; ComponentLink2URL: https://jlcpcb.com/partdetail/C396744; ComponentLink3Description: LCSC Part URL; ComponentLink3URL: https://lcsc.com/product-detail/Multilayer-Ceramic-Capacitors-MLCC---SMD-SMT_Walsin-Tech-Corp-Walsin-Tech-Corp-0805N102J101CT_C396744.html
footprint CAP-0805 (0805 (2012M) Capacitor)
pins: 1, 2

## 0805N102J201
designator C?  Capacitance: 1nF  (hidden comment: *)
Capacitor, Ceramic (MLCC), 1nF, ±5%, 200V, NP0, ±5%, SMD 0805; Manufacturer: Walsin Tech Corp; Manufacturer Part Number: 0805N102J201; Package Size: 0805; JLCPCB Basic Part: No; JLCPCB Part Number: C77484; Supplier 1: LCSC; Category: Capacitors - MLCC; Supplier Part Number 1: C77484; Tolerance: ±5%; Voltage Rating: 200V; Temperature Coefficient: NP0; RoHS: Yes; ComponentLink1Description: Datasheet; ComponentLink1URL: https://wmsc.lcsc.com/wmsc/upload/file/pdf/v2/lcsc/2304140030_Walsin-Tech-Corp-0805N102J201_C77484.pdf; ComponentLink2Description: JLCPCB Part URL; ComponentLink2URL: https://jlcpcb.com/partdetail/C77484; ComponentLink3Description: LCSC Part URL; ComponentLink3URL: https://lcsc.com/product-detail/Multilayer-Ceramic-Capacitors-MLCC---SMD-SMT_Walsin-Tech-Corp-Walsin-Tech-Corp-0805N102J201_C77484.html
footprint CAP-0805 (0805 (2012M) Capacitor)
pins: 1, 2

## 0805N102J201CT
designator C?  Capacitance: 1nF  (hidden comment: *)
Capacitor, Ceramic (MLCC), 1nF, ±5%, 200V, NP0, ±5%, SMD 0805; Manufacturer: Walsin Tech Corp; Manufacturer Part Number: 0805N102J201CT; Package Size: 0805; JLCPCB Basic Part: No; JLCPCB Part Number: C2992629; Supplier 1: LCSC; Category: Capacitors - MLCC; Supplier Part Number 1: C2992629; Tolerance: ±5%; Voltage Rating: 200V; Temperature Coefficient: NP0; RoHS: Yes; ComponentLink1Description: Datasheet; ComponentLink1URL: https://wmsc.lcsc.com/wmsc/upload/file/pdf/v2/lcsc/2204121445_Walsin-Tech-Corp-0805N102J201CT_C2992629.pdf; ComponentLink2Description: JLCPCB Part URL; ComponentLink2URL: https://jlcpcb.com/partdetail/C2992629; ComponentLink3Description: LCSC Part URL; ComponentLink3URL: https://lcsc.com/product-detail/Multilayer-Ceramic-Capacitors-MLCC---SMD-SMT_Walsin-Tech-Corp-Walsin-Tech-Corp-0805N102J201CT_C2992629.html
footprint CAP-0805 (0805 (2012M) Capacitor)
pins: 1, 2

## 0805N102J251CT
designator C?  Capacitance: 1nF  (hidden comment: *)
Capacitor, Ceramic (MLCC), 1nF, ±5%, 250V, NP0, ±5%, SMD 0805; Manufacturer: Walsin Tech Corp; Manufacturer Part Number: 0805N102J251CT; Package Size: 0805; JLCPCB Basic Part: No; JLCPCB Part Number: C237165; Supplier 1: LCSC; Category: Capacitors - MLCC; Supplier Part Number 1: C237165; Tolerance: ±5%; Voltage Rating: 250V; Temperature Coefficient: NP0; RoHS: Yes; ComponentLink1Description: Datasheet; ComponentLink1URL: https://wmsc.lcsc.com/wmsc/upload/file/pdf/v2/lcsc/2304140030_Walsin-Tech-Corp-0805N102J251CT_C237165.pdf; ComponentLink2Description: JLCPCB Part URL; ComponentLink2URL: https://jlcpcb.com/partdetail/C237165; ComponentLink3Description: LCSC Part URL; ComponentLink3URL: https://lcsc.com/product-detail/Multilayer-Ceramic-Capacitors-MLCC---SMD-SMT_Walsin-Tech-Corp-Walsin-Tech-Corp-0805N102J251CT_C237165.html
footprint CAP-0805 (0805 (2012M) Capacitor)
pins: 1, 2

## 0805N102J500CT
designator C?  Capacitance: 1nF  (hidden comment: *)
Capacitor, Ceramic (MLCC), 1nF, ±5%, 50V, NP0, ±5%, SMD 0805; Manufacturer: Walsin Tech Corp; Manufacturer Part Number: 0805N102J500CT; Package Size: 0805; JLCPCB Basic Part: No; JLCPCB Part Number: C152850; Supplier 1: LCSC; Category: Capacitors - MLCC; Supplier Part Number 1: C152850; Tolerance: ±5%; Voltage Rating: 50V; Temperature Coefficient: NP0; RoHS: Yes; ComponentLink1Description: Datasheet; ComponentLink1URL: https://wmsc.lcsc.com/wmsc/upload/file/pdf/v2/lcsc/2304140030_Walsin-Tech-Corp-0805N102J500CT_C152850.pdf; ComponentLink2Description: JLCPCB Part URL; ComponentLink2URL: https://jlcpcb.com/partdetail/C152850; ComponentLink3Description: LCSC Part URL; ComponentLink3URL: https://lcsc.com/product-detail/Multilayer-Ceramic-Capacitors-MLCC---SMD-SMT_Walsin-Tech-Corp-Walsin-Tech-Corp-0805N102J500CT_C152850.html
footprint CAP-0805 (0805 (2012M) Capacitor)
pins: 1, 2

## 0805N102J501CT
designator C?  Capacitance: 1nF  (hidden comment: *)
Capacitor, Ceramic (MLCC), 1nF, ±5%, 500V, NP0, ±5%, SMD 0805; Manufacturer: Walsin Tech Corp; Manufacturer Part Number: 0805N102J501CT; Package Size: 0805; JLCPCB Basic Part: No; JLCPCB Part Number: C2991460; Supplier 1: LCSC; Category: Capacitors - MLCC; Supplier Part Number 1: C2991460; Tolerance: ±5%; Voltage Rating: 500V; Temperature Coefficient: NP0; RoHS: Yes; ComponentLink1Description: Datasheet; ComponentLink1URL: https://wmsc.lcsc.com/wmsc/upload/file/pdf/v2/lcsc/2204081830_Walsin-Tech-Corp-0805N102J501CT_C2991460.pdf; ComponentLink2Description: JLCPCB Part URL; ComponentLink2URL: https://jlcpcb.com/partdetail/C2991460; ComponentLink3Description: LCSC Part URL; ComponentLink3URL: https://lcsc.com/product-detail/Multilayer-Ceramic-Capacitors-MLCC---SMD-SMT_Walsin-Tech-Corp-Walsin-Tech-Corp-0805N102J501CT_C2991460.html
footprint CAP-0805 (0805 (2012M) Capacitor)
pins: 1, 2

## 0805N103J160CT
designator C?  Capacitance: 10nF  (hidden comment: *)
Capacitor, Ceramic (MLCC), 10nF, ±5%, 16V, NP0, ±5%, SMD 0805; Manufacturer: Walsin Tech Corp; Manufacturer Part Number: 0805N103J160CT; Package Size: 0805; JLCPCB Basic Part: No; JLCPCB Part Number: C575473; Supplier 1: LCSC; Category: Capacitors - MLCC; Supplier Part Number 1: C575473; Tolerance: ±5%; Voltage Rating: 16V; Temperature Coefficient: NP0; RoHS: Yes; ComponentLink1Description: Datasheet; ComponentLink1URL: https://wmsc.lcsc.com/wmsc/upload/file/pdf/v2/lcsc/2304140030_Walsin-Tech-Corp-0805N103J160CT_C575473.pdf; ComponentLink2Description: JLCPCB Part URL; ComponentLink2URL: https://jlcpcb.com/partdetail/C575473; ComponentLink3Description: LCSC Part URL; ComponentLink3URL: https://lcsc.com/product-detail/Multilayer-Ceramic-Capacitors-MLCC---SMD-SMT_Walsin-Tech-Corp-Walsin-Tech-Corp-0805N103J160CT_C575473.html
footprint CAP-0805 (0805 (2012M) Capacitor)
pins: 1, 2

## 0805N103J500CT
designator C?  Capacitance: 10nF  (hidden comment: *)
Capacitor, Ceramic (MLCC), 10nF, ±5%, 50V, NP0, ±5%, SMD 0805; Manufacturer: Walsin Tech Corp; Manufacturer Part Number: 0805N103J500CT; Package Size: 0805; JLCPCB Basic Part: No; JLCPCB Part Number: C237168; Supplier 1: LCSC; Category: Capacitors - MLCC; Supplier Part Number 1: C237168; Tolerance: ±5%; Voltage Rating: 50V; Temperature Coefficient: NP0; RoHS: Yes; ComponentLink1Description: Datasheet; ComponentLink1URL: https://wmsc.lcsc.com/wmsc/upload/file/pdf/v2/lcsc/2304140030_Walsin-Tech-Corp-0805N103J500CT_C237168.pdf; ComponentLink2Description: JLCPCB Part URL; ComponentLink2URL: https://jlcpcb.com/partdetail/C237168; ComponentLink3Description: LCSC Part URL; ComponentLink3URL: https://lcsc.com/product-detail/Multilayer-Ceramic-Capacitors-MLCC---SMD-SMT_Walsin-Tech-Corp-Walsin-Tech-Corp-0805N103J500CT_C237168.html
footprint CAP-0805 (0805 (2012M) Capacitor)
pins: 1, 2

## 0805N110J500CT
designator C?  Capacitance: 11pF  (hidden comment: *)
Capacitor, Ceramic (MLCC), 11pF, ±5%, 50V, NP0, ±5%, SMD 0805; Manufacturer: Walsin Tech Corp; Manufacturer Part Number: 0805N110J500CT; Package Size: 0805; JLCPCB Basic Part: No; JLCPCB Part Number: C469640; Supplier 1: LCSC; Category: Capacitors - MLCC; Supplier Part Number 1: C469640; Tolerance: ±5%; Voltage Rating: 50V; Temperature Coefficient: NP0; RoHS: Yes; ComponentLink1Description: Datasheet; ComponentLink1URL: https://wmsc.lcsc.com/wmsc/upload/file/pdf/v2/lcsc/2304140030_Walsin-Tech-Corp-0805N110J500CT_C469640.pdf; ComponentLink2Description: JLCPCB Part URL; ComponentLink2URL: https://jlcpcb.com/partdetail/C469640; ComponentLink3Description: LCSC Part URL; ComponentLink3URL: https://lcsc.com/product-detail/Multilayer-Ceramic-Capacitors-MLCC---SMD-SMT_Walsin-Tech-Corp-Walsin-Tech-Corp-0805N110J500CT_C469640.html
footprint CAP-0805 (0805 (2012M) Capacitor)
pins: 1, 2

## 0805N120J101
designator C?  Capacitance: 12pF  (hidden comment: *)
Capacitor, Ceramic (MLCC), 12pF, ±5%, 100V, NP0, ±5%, SMD 0805; Manufacturer: Walsin Tech Corp; Manufacturer Part Number: 0805N120J101; Package Size: 0805; JLCPCB Basic Part: No; JLCPCB Part Number: C152849; Supplier 1: LCSC; Category: Capacitors - MLCC; Supplier Part Number 1: C152849; Tolerance: ±5%; Voltage Rating: 100V; Temperature Coefficient: NP0; RoHS: Yes; ComponentLink1Description: Datasheet; ComponentLink1URL: https://wmsc.lcsc.com/wmsc/upload/file/pdf/v2/lcsc/2304140030_Walsin-Tech-Corp-0805N120J101_C152849.pdf; ComponentLink2Description: JLCPCB Part URL; ComponentLink2URL: https://jlcpcb.com/partdetail/C152849; ComponentLink3Description: LCSC Part URL; ComponentLink3URL: https://lcsc.com/product-detail/Multilayer-Ceramic-Capacitors-MLCC---SMD-SMT_Walsin-Tech-Corp-Walsin-Tech-Corp-0805N120J101_C152849.html
footprint CAP-0805 (0805 (2012M) Capacitor)
pins: 1, 2

## 0805N120J251CT
designator C?  Capacitance: 12pF  (hidden comment: *)
Capacitor, Ceramic (MLCC), 12pF, ±5%, 250V, NP0, ±5%, SMD 0805; Manufacturer: Walsin Tech Corp; Manufacturer Part Number: 0805N120J251CT; Package Size: 0805; JLCPCB Basic Part: No; JLCPCB Part Number: C509270; Supplier 1: LCSC; Category: Capacitors - MLCC; Supplier Part Number 1: C509270; Tolerance: ±5%; Voltage Rating: 250V; Temperature Coefficient: NP0; RoHS: Yes; ComponentLink1Description: Datasheet; ComponentLink1URL: https://wmsc.lcsc.com/wmsc/upload/file/pdf/v2/lcsc/2304140030_Walsin-Tech-Corp-0805N120J251CT_C509270.pdf; ComponentLink2Description: JLCPCB Part URL; ComponentLink2URL: https://jlcpcb.com/partdetail/C509270; ComponentLink3Description: LCSC Part URL; ComponentLink3URL: https://lcsc.com/product-detail/Multilayer-Ceramic-Capacitors-MLCC---SMD-SMT_Walsin-Tech-Corp-Walsin-Tech-Corp-0805N120J251CT_C509270.html
footprint CAP-0805 (0805 (2012M) Capacitor)
pins: 1, 2

## 0805N120J500CT
designator C?  Capacitance: 12pF  (hidden comment: *)
Capacitor, Ceramic (MLCC), 12pF, ±5%, 50V, NP0, ±5%, SMD 0805; Manufacturer: Walsin Tech Corp; Manufacturer Part Number: 0805N120J500CT; Package Size: 0805; JLCPCB Basic Part: No; JLCPCB Part Number: C152848; Supplier 1: LCSC; Category: Capacitors - MLCC; Supplier Part Number 1: C152848; Tolerance: ±5%; Voltage Rating: 50V; Temperature Coefficient: NP0; RoHS: Yes; ComponentLink1Description: Datasheet; ComponentLink1URL: https://wmsc.lcsc.com/wmsc/upload/file/pdf/v2/lcsc/2304140030_Walsin-Tech-Corp-0805N120J500CT_C152848.pdf; ComponentLink2Description: JLCPCB Part URL; ComponentLink2URL: https://jlcpcb.com/partdetail/C152848; ComponentLink3Description: LCSC Part URL; ComponentLink3URL: https://lcsc.com/product-detail/Multilayer-Ceramic-Capacitors-MLCC---SMD-SMT_Walsin-Tech-Corp-Walsin-Tech-Corp-0805N120J500CT_C152848.html
footprint CAP-0805 (0805 (2012M) Capacitor)
pins: 1, 2

## 0805N121J201CT
designator C?  Capacitance: 120pF  (hidden comment: *)
Capacitor, Ceramic (MLCC), 120pF, ±5%, 200V, NP0, ±5%, SMD 0805; Manufacturer: Walsin Tech Corp; Manufacturer Part Number: 0805N121J201CT; Package Size: 0805; JLCPCB Basic Part: No; JLCPCB Part Number: C458932; Supplier 1: LCSC; Category: Capacitors - MLCC; Supplier Part Number 1: C458932; Tolerance: ±5%; Voltage Rating: 200V; Temperature Coefficient: NP0; RoHS: Yes; ComponentLink1Description: Datasheet; ComponentLink1URL: https://wmsc.lcsc.com/wmsc/upload/file/pdf/v2/lcsc/2304140030_Walsin-Tech-Corp-0805N121J201CT_C458932.pdf; ComponentLink2Description: JLCPCB Part URL; ComponentLink2URL: https://jlcpcb.com/partdetail/C458932; ComponentLink3Description: LCSC Part URL; ComponentLink3URL: https://lcsc.com/product-detail/Multilayer-Ceramic-Capacitors-MLCC---SMD-SMT_Walsin-Tech-Corp-Walsin-Tech-Corp-0805N121J201CT_C458932.html
footprint CAP-0805 (0805 (2012M) Capacitor)
pins: 1, 2

## 0805N121J500CT
designator C?  Capacitance: 120pF  (hidden comment: *)
Capacitor, Ceramic (MLCC), 120pF, ±5%, 50V, NP0, ±5%, SMD 0805; Manufacturer: Walsin Tech Corp; Manufacturer Part Number: 0805N121J500CT; Package Size: 0805; JLCPCB Basic Part: No; JLCPCB Part Number: C237175; Supplier 1: LCSC; Category: Capacitors - MLCC; Supplier Part Number 1: C237175; Tolerance: ±5%; Voltage Rating: 50V; Temperature Coefficient: NP0; RoHS: Yes; ComponentLink1Description: Datasheet; ComponentLink1URL: https://wmsc.lcsc.com/wmsc/upload/file/pdf/v2/lcsc/2304140030_Walsin-Tech-Corp-0805N121J500CT_C237175.pdf; ComponentLink2Description: JLCPCB Part URL; ComponentLink2URL: https://jlcpcb.com/partdetail/C237175; ComponentLink3Description: LCSC Part URL; ComponentLink3URL: https://lcsc.com/product-detail/Multilayer-Ceramic-Capacitors-MLCC---SMD-SMT_Walsin-Tech-Corp-Walsin-Tech-Corp-0805N121J500CT_C237175.html
footprint CAP-0805 (0805 (2012M) Capacitor)
pins: 1, 2

## 0805N122F500CT
designator C?  Capacitance: 1.2nF  (hidden comment: *)
Capacitor, Ceramic (MLCC), 1.2nF, ±1%, 50V, NP0, ±1%, SMD 0805; Manufacturer: Walsin Tech Corp; Manufacturer Part Number: 0805N122F500CT; Package Size: 0805; JLCPCB Basic Part: No; JLCPCB Part Number: C3847393; Supplier 1: LCSC; Category: Capacitors - MLCC; Supplier Part Number 1: C3847393; Tolerance: ±1%; Voltage Rating: 50V; Temperature Coefficient: NP0; RoHS: Yes; ComponentLink1Description: Datasheet; ComponentLink1URL: https://wmsc.lcsc.com/wmsc/upload/file/pdf/v2/lcsc/2309201537_Walsin-Tech-Corp-0805N122F500CT_C3847393.pdf; ComponentLink2Description: JLCPCB Part URL; ComponentLink2URL: https://jlcpcb.com/partdetail/C3847393; ComponentLink3Description: LCSC Part URL; ComponentLink3URL: https://lcsc.com/product-detail/Multilayer-Ceramic-Capacitors-MLCC---SMD-SMT_Walsin-Tech-Corp-Walsin-Tech-Corp-0805N122F500CT_C3847393.html
footprint CAP-0805 (0805 (2012M) Capacitor)
pins: 1, 2

## 0805N122J500CT
designator C?  Capacitance: 1.2nF  (hidden comment: *)
Capacitor, Ceramic (MLCC), 1.2nF, ±5%, 50V, NP0, ±5%, SMD 0805; Manufacturer: Walsin Tech Corp; Manufacturer Part Number: 0805N122J500CT; Package Size: 0805; JLCPCB Basic Part: No; JLCPCB Part Number: C340640; Supplier 1: LCSC; Category: Capacitors - MLCC; Supplier Part Number 1: C340640; Tolerance: ±5%; Voltage Rating: 50V; Temperature Coefficient: NP0; RoHS: Yes; ComponentLink1Description: Datasheet; ComponentLink1URL: https://wmsc.lcsc.com/wmsc/upload/file/pdf/v2/lcsc/2304140030_Walsin-Tech-Corp-0805N122J500CT_C340640.pdf; ComponentLink2Description: JLCPCB Part URL; ComponentLink2URL: https://jlcpcb.com/partdetail/C340640; ComponentLink3Description: LCSC Part URL; ComponentLink3URL: https://lcsc.com/product-detail/Multilayer-Ceramic-Capacitors-MLCC---SMD-SMT_Walsin-Tech-Corp-Walsin-Tech-Corp-0805N122J500CT_C340640.html
footprint CAP-0805 (0805 (2012M) Capacitor)
pins: 1, 2
